# Altium schematic symbol library 场效应管.SchLib: 1062 symbols (part 3 of 4)
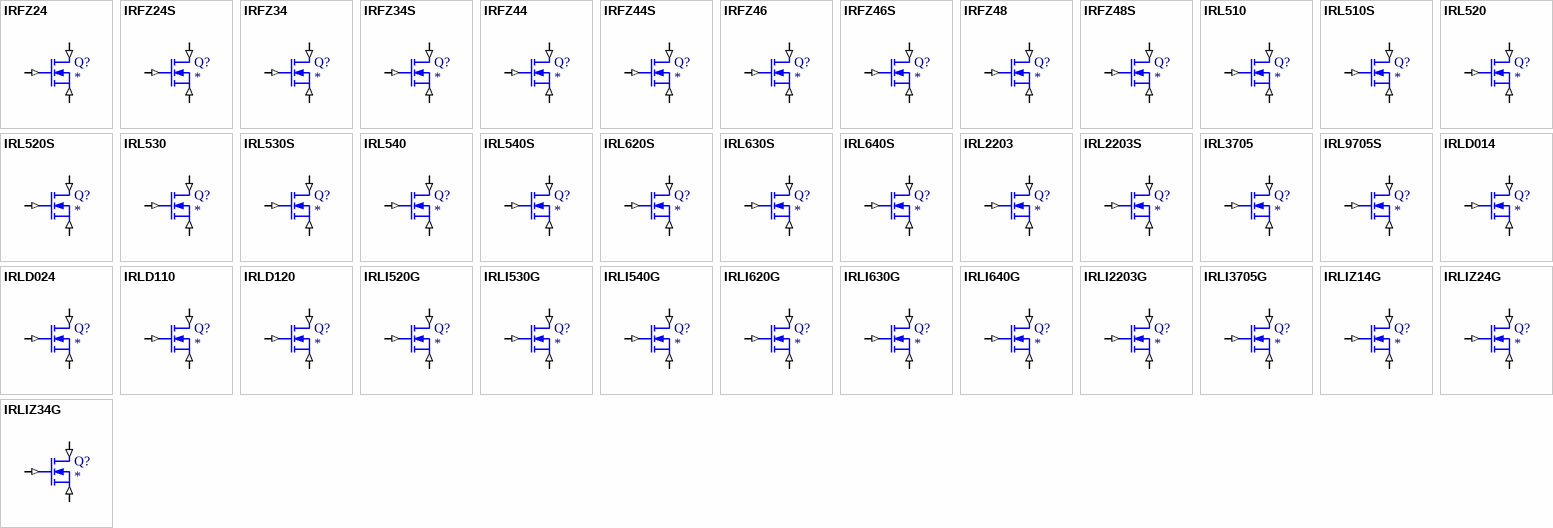
[diagram p28: symbols IRFZ24 to IRLIZ34G]

## IRL630S
designator Q?
N-Channel MOSFET
simulation model IRL630S (SUBCKT)
pins: 1 D (in), 2 G (in), 3 S (in)
1 alternate drawing of the same symbol

## IRL640S
designator Q?
N-Channel MOSFET
simulation model IRL640S (SUBCKT)
pins: 1 D (in), 2 G (in), 3 S (in)
1 alternate drawing of the same symbol

## IRL2203
designator Q?
N-Channel MOSFET
simulation model IRL2203 (SUBCKT)
pins: 1 D (in), 2 G (in), 3 S (in)
1 alternate drawing of the same symbol

## IRL2203S
designator Q?
N-Channel MOSFET
simulation model IRL2203S (SUBCKT)
pins: 1 D (in), 2 G (in), 3 S (in)
1 alternate drawing of the same symbol

## IRL3705
designator Q?
N-Channel MOSFET
simulation model IRL3705 (SUBCKT)
pins: 1 D (in), 2 G (in), 3 S (in)
1 alternate drawing of the same symbol

## IRL9705S
designator Q?
N-Channel MOSFET
simulation model IRL9705S (SUBCKT)
pins: 1 D (in), 2 G (in), 3 S (in)
1 alternate drawing of the same symbol

## IRLD014
designator Q?
N-Channel MOSFET
simulation model IRLD014 (SUBCKT)
pins: 1 D (in), 2 G (in), 3 S (in)
1 alternate drawing of the same symbol

## IRLD024
designator Q?
N-Channel MOSFET
simulation model IRLD024 (SUBCKT)
pins: 1 D (in), 2 G (in), 3 S (in)
1 alternate drawing of the same symbol

## IRLD110
designator Q?
N-Channel MOSFET
simulation model IRLD110 (SUBCKT)
pins: 1 D (in), 2 G (in), 3 S (in)
1 alternate drawing of the same symbol

## IRLD120
designator Q?
N-Channel MOSFET
simulation model IRLD120 (SUBCKT)
pins: 1 D (in), 2 G (in), 3 S (in)
1 alternate drawing of the same symbol

## IRLI520G
designator Q?
N-Channel MOSFET
simulation model IRLI520G (SUBCKT)
pins: 1 D (in), 2 G (in), 3 S (in)
1 alternate drawing of the same symbol

## IRLI530G
designator Q?
N-Channel MOSFET
simulation model IRLI530G (SUBCKT)
pins: 1 D (in), 2 G (in), 3 S (in)
1 alternate drawing of the same symbol

## IRLI540G
designator Q?
N-Channel MOSFET
simulation model IRLI540G (SUBCKT)
pins: 1 D (in), 2 G (in), 3 S (in)
1 alternate drawing of the same symbol

## IRLI620G
designator Q?
N-Channel MOSFET
simulation model IRLI620G (SUBCKT)
pins: 1 D (in), 2 G (in), 3 S (in)
1 alternate drawing of the same symbol

## IRLI630G
designator Q?
N-Channel MOSFET
simulation model IRLI630G (SUBCKT)
pins: 1 D (in), 2 G (in), 3 S (in)
1 alternate drawing of the same symbol

## IRLI640G
designator Q?
N-Channel MOSFET
simulation model IRLI640G (SUBCKT)
pins: 1 D (in), 2 G (in), 3 S (in)
1 alternate drawing of the same symbol

## IRLI2203G
designator Q?
N-Channel MOSFET
simulation model IRLI2203G (SUBCKT)
pins: 1 D (in), 2 G (in), 3 S (in)
1 alternate drawing of the same symbol

## IRLI3705G
designator Q?
N-Channel MOSFET
simulation model IRLI3705G (SUBCKT)
pins: 1 D (in), 2 G (in), 3 S (in)
1 alternate drawing of the same symbol

## IRLIZ14G
designator Q?
N-Channel MOSFET
simulation model IRLIZ14G (SUBCKT)
pins: 1 D (in), 2 G (in), 3 S (in)
1 alternate drawing of the same symbol

## IRLIZ24G
designator Q?
N-Channel MOSFET
simulation model IRLIZ24G (SUBCKT)
pins: 1 D (in), 2 G (in), 3 S (in)
1 alternate drawing of the same symbol

## IRLIZ34G
designator Q?
N-Channel MOSFET
simulation model IRLIZ34G (SUBCKT)
pins: 1 D (in), 2 G (in), 3 S (in)
1 alternate drawing of the same symbol

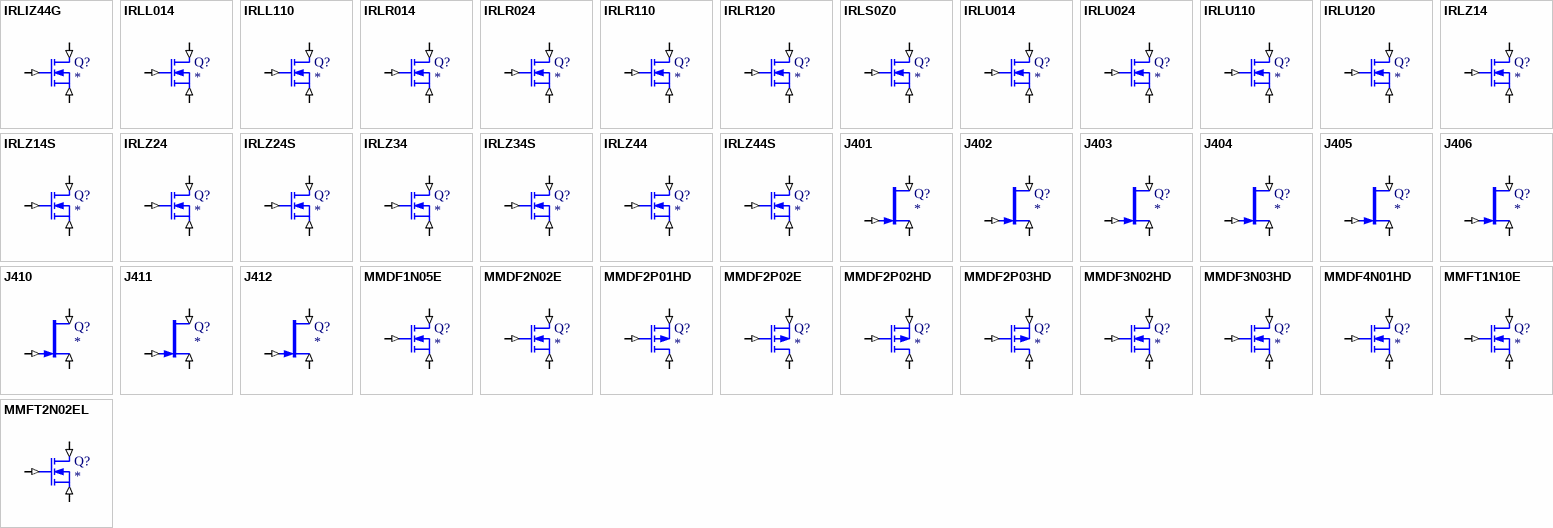
[diagram p17: symbols IRLIZ44G to MMFT2N02EL]

## IRLIZ44G
designator Q?
N-Channel MOSFET
simulation model IRLIZ44G (SUBCKT)
pins: 1 D (in), 2 G (in), 3 S (in)
1 alternate drawing of the same symbol

## IRLL014
designator Q?
N-Channel MOSFET
simulation model IRLL014 (SUBCKT)
pins: 1 D (in), 2 G (in), 3 S (in)
1 alternate drawing of the same symbol

## IRLL110
designator Q?
N-Channel MOSFET
simulation model IRLL110 (SUBCKT)
pins: 1 D (in), 2 G (in), 3 S (in)
1 alternate drawing of the same symbol

## IRLR014
designator Q?
N-Channel MOSFET
simulation model IRLR014 (SUBCKT)
pins: 1 D (in), 2 G (in), 3 S (in)
1 alternate drawing of the same symbol

## IRLR024
designator Q?
N-Channel MOSFET
simulation model IRLR024 (SUBCKT)
pins: 1 D (in), 2 G (in), 3 S (in)
1 alternate drawing of the same symbol

## IRLR110
designator Q?
N-Channel MOSFET
simulation model IRLR110 (SUBCKT)
pins: 1 D (in), 2 G (in), 3 S (in)
1 alternate drawing of the same symbol

## IRLR120
designator Q?
N-Channel MOSFET
simulation model IRLR120 (SUBCKT)
pins: 1 D (in), 2 G (in), 3 S (in)
1 alternate drawing of the same symbol

## IRLS0Z0
designator Q?
N-Channel MOSFET
simulation model IRLS0Z0 (SUBCKT)
pins: 1 D (in), 2 G (in), 3 S (in)
1 alternate drawing of the same symbol

## IRLU014
designator Q?
N-Channel MOSFET
simulation model IRLU014 (SUBCKT)
pins: 1 D (in), 2 G (in), 3 S (in)
1 alternate drawing of the same symbol

## IRLU024
designator Q?
N-Channel MOSFET
simulation model IRLU024 (SUBCKT)
pins: 1 D (in), 2 G (in), 3 S (in)
1 alternate drawing of the same symbol

## IRLU110
designator Q?
N-Channel MOSFET
simulation model IRLU110 (SUBCKT)
pins: 1 D (in), 2 G (in), 3 S (in)
1 alternate drawing of the same symbol

## IRLU120
designator Q?
N-Channel MOSFET
simulation model IRLU120 (SUBCKT)
pins: 1 D (in), 2 G (in), 3 S (in)
1 alternate drawing of the same symbol

## IRLZ14
designator Q?
N-Channel MOSFET
simulation model IRLZ14 (SUBCKT)
pins: 1 D (in), 2 G (in), 3 S (in)
1 alternate drawing of the same symbol

## IRLZ14S
designator Q?
N-Channel MOSFET
simulation model IRLZ14S (SUBCKT)
pins: 1 D (in), 2 G (in), 3 S (in)
1 alternate drawing of the same symbol

## IRLZ24
designator Q?
N-Channel MOSFET
simulation model IRLZ24 (SUBCKT)
pins: 1 D (in), 2 G (in), 3 S (in)
1 alternate drawing of the same symbol

## IRLZ24S
designator Q?
N-Channel MOSFET
simulation model IRLZ24S (SUBCKT)
pins: 1 D (in), 2 G (in), 3 S (in)
1 alternate drawing of the same symbol

## IRLZ34
designator Q?
N-Channel MOSFET
simulation model IRLZ34 (SUBCKT)
pins: 1 D (in), 2 G (in), 3 S (in)
1 alternate drawing of the same symbol

## IRLZ34S
designator Q?
N-Channel MOSFET
simulation model IRLZ34S (SUBCKT)
pins: 1 D (in), 2 G (in), 3 S (in)
1 alternate drawing of the same symbol

## IRLZ44
designator Q?
N-Channel MOSFET
simulation model IRLZ44 (SUBCKT)
pins: 1 D (in), 2 G (in), 3 S (in)
1 alternate drawing of the same symbol

## IRLZ44S
designator Q?
N-Channel MOSFET
simulation model IRLZ44S (SUBCKT)
pins: 1 D (in), 2 G (in), 3 S (in)
1 alternate drawing of the same symbol

## J401
designator Q?
N-Channel JFET
simulation model J401 (NJFET)
pins: 1 D (in), 2 G (in), 3 S (in)
1 alternate drawing of the same symbol

## J402
designator Q?
N-Channel JFET
simulation model J402 (NJFET)
pins: 1 D (in), 2 G (in), 3 S (in)
1 alternate drawing of the same symbol

## J403
designator Q?
N-Channel JFET
simulation model J403 (NJFET)
pins: 1 D (in), 2 G (in), 3 S (in)
1 alternate drawing of the same symbol

## J404
designator Q?
N-Channel JFET
simulation model J404 (NJFET)
pins: 1 D (in), 2 G (in), 3 S (in)
1 alternate drawing of the same symbol

## J405
designator Q?
N-Channel JFET
simulation model J405 (NJFET)
pins: 1 D (in), 2 G (in), 3 S (in)
1 alternate drawing of the same symbol

## J406
designator Q?
N-Channel JFET
simulation model J406 (NJFET)
pins: 1 D (in), 2 G (in), 3 S (in)
1 alternate drawing of the same symbol

## J410
designator Q?
N-Channel JFET
simulation model J410 (NJFET)
pins: 1 D (in), 2 G (in), 3 S (in)
1 alternate drawing of the same symbol

## J411
designator Q?
N-Channel JFET
simulation model J411 (NJFET)
pins: 1 D (in), 2 G (in), 3 S (in)
1 alternate drawing of the same symbol

## J412
designator Q?
N-Channel JFET
simulation model J412 (NJFET)
pins: 1 D (in), 2 G (in), 3 S (in)
1 alternate drawing of the same symbol

## MMDF1N05E
designator Q?
N-Channel MOSFET
simulation model MMDF1N05E (SUBCKT)
pins: 1 D (in), 2 G (in), 3 S (in)
1 alternate drawing of the same symbol

## MMDF2N02E
designator Q?
N-Channel MOSFET
simulation model MMDF2N02E (SUBCKT)
pins: 1 D (in), 2 G (in), 3 S (in)
1 alternate drawing of the same symbol

## MMDF2P01HD
designator Q?
P-Channel MOSFET
simulation model MMDF2P01HD (SUBCKT)
pins: 1 D (in), 2 G (in), 3 S (in)
1 alternate drawing of the same symbol

## MMDF2P02E
designator Q?
P-Channel MOSFET
simulation model MMDF2P02E (SUBCKT)
pins: 1 D (in), 2 G (in), 3 S (in)
1 alternate drawing of the same symbol

## MMDF2P02HD
designator Q?
P-Channel MOSFET
simulation model MMDF2P02HD (SUBCKT)
pins: 1 D (in), 2 G (in), 3 S (in)
1 alternate drawing of the same symbol

## MMDF2P03HD
designator Q?
P-Channel MOSFET
simulation model MMDF2P03HD (SUBCKT)
pins: 1 D (in), 2 G (in), 3 S (in)
1 alternate drawing of the same symbol

## MMDF3N02HD
designator Q?
N-Channel MOSFET
simulation model MMDF3N02HD (SUBCKT)
pins: 1 D (in), 2 G (in), 3 S (in)
1 alternate drawing of the same symbol

## MMDF3N03HD
designator Q?
N-Channel MOSFET
simulation model MMDF3N03HD (SUBCKT)
pins: 1 D (in), 2 G (in), 3 S (in)
1 alternate drawing of the same symbol

## MMDF4N01HD
designator Q?
N-Channel MOSFET
simulation model MMDF4N01HD (SUBCKT)
pins: 1 D (in), 2 G (in), 3 S (in)
1 alternate drawing of the same symbol

## MMFT1N10E
designator Q?
N-Channel MOSFET
simulation model MMFT1N10E (SUBCKT)
pins: 1 D (in), 2 G (in), 3 S (in)
1 alternate drawing of the same symbol

## MMFT2N02EL
designator Q?
N-Channel MOSFET
simulation model MMFT2N02EL (SUBCKT)
pins: 1 D (in), 2 G (in), 3 S (in)
1 alternate drawing of the same symbol

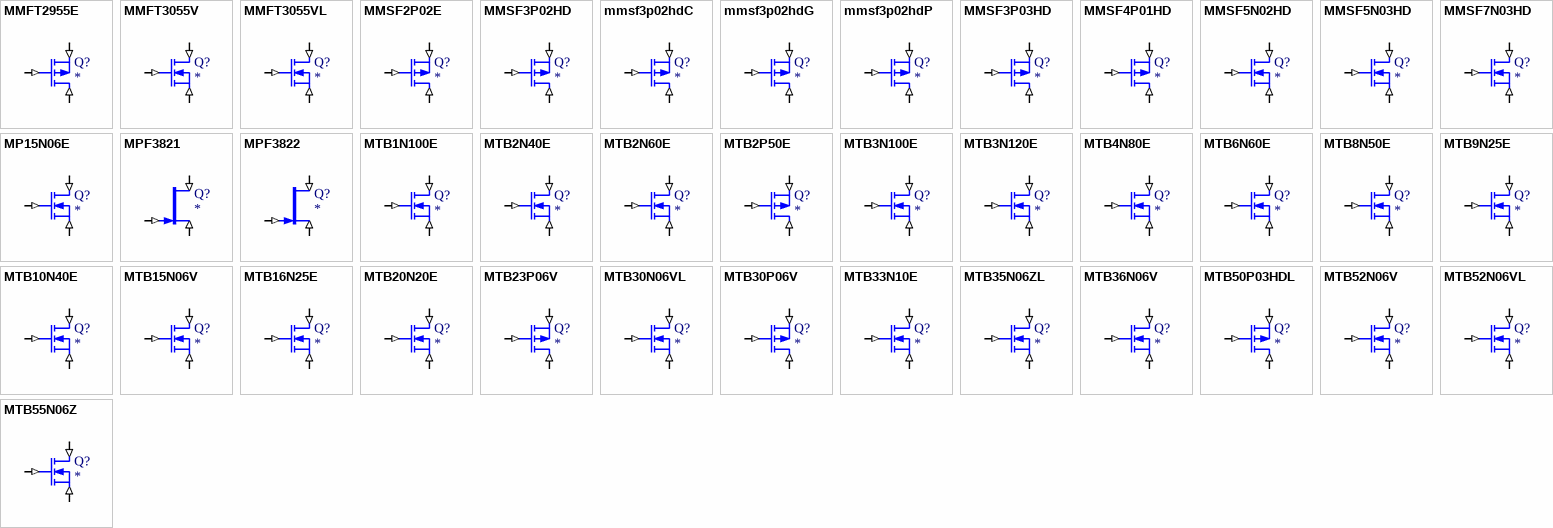
[diagram p18: symbols MMFT2955E to MTB55N06Z]

## MMFT2955E
designator Q?
P-Channel MOSFET
simulation model MMFT2955E (SUBCKT)
pins: 1 D (in), 2 G (in), 3 S (in)
1 alternate drawing of the same symbol

## MMFT3055V
designator Q?
N-Channel MOSFET
simulation model MMFT3055V (SUBCKT)
pins: 1 D (in), 2 G (in), 3 S (in)
1 alternate drawing of the same symbol

## MMFT3055VL
designator Q?
N-Channel MOSFET
simulation model MMFT3055VL (SUBCKT)
pins: 1 D (in), 2 G (in), 3 S (in)
1 alternate drawing of the same symbol

## MMSF2P02E
designator Q?
P-Channel MOSFET
simulation model MMSF2P02E (SUBCKT)
pins: 1 D (in), 2 G (in), 3 S (in)
1 alternate drawing of the same symbol

## MMSF3P02HD
designator Q?
P-Channel MOSFET
simulation model MMSF3P02HD (SUBCKT)
pins: 1 D (in), 2 G (in), 3 S (in)
1 alternate drawing of the same symbol

## mmsf3p02hdC
designator Q?
P-Channel MOSFET
simulation model mmsf3p02hdC (SUBCKT)
pins: 1 D (in), 2 G (in), 3 S (in)
1 alternate drawing of the same symbol

## mmsf3p02hdG
designator Q?
P-Channel MOSFET
simulation model mmsf3p02hdG (SUBCKT)
pins: 1 D (in), 2 G (in), 3 S (in)
1 alternate drawing of the same symbol

## mmsf3p02hdP
designator Q?
P-Channel MOSFET
simulation model mmsf3p02hdP (SUBCKT)
pins: 1 D (in), 2 G (in), 3 S (in)
1 alternate drawing of the same symbol

## MMSF3P03HD
designator Q?
P-Channel MOSFET
simulation model MMSF3P03HD (SUBCKT)
pins: 1 D (in), 2 G (in), 3 S (in)
1 alternate drawing of the same symbol

## MMSF4P01HD
designator Q?
P-Channel MOSFET
simulation model MMSF4P01HD (SUBCKT)
pins: 1 D (in), 2 G (in), 3 S (in)
1 alternate drawing of the same symbol

## MMSF5N02HD
designator Q?
N-Channel MOSFET
simulation model MMSF5N02HD (SUBCKT)
pins: 1 D (in), 2 G (in), 3 S (in)
1 alternate drawing of the same symbol

## MMSF5N03HD
designator Q?
N-Channel MOSFET
simulation model MMSF5N03HD (SUBCKT)
pins: 1 D (in), 2 G (in), 3 S (in)
1 alternate drawing of the same symbol

## MMSF7N03HD
designator Q?
N-Channel MOSFET
simulation model MMSF7N03HD (SUBCKT)
pins: 1 D (in), 2 G (in), 3 S (in)
1 alternate drawing of the same symbol

## MP15N06E
designator Q?
N-Channel MOSFET
simulation model MP15N06E (SUBCKT)
pins: 1 D (in), 2 G (in), 3 S (in)
1 alternate drawing of the same symbol

## MPF3821
designator Q?
N-Channel JFET
simulation model MPF3821 (NJFET)
pins: 1 D (in), 2 G (in), 3 S (in)
1 alternate drawing of the same symbol

## MPF3822
designator Q?
N-Channel JFET
simulation model MPF3822 (NJFET)
pins: 1 D (in), 2 G (in), 3 S (in)
1 alternate drawing of the same symbol

## MTB1N100E
designator Q?
N-Channel MOSFET
simulation model MTB1N100E (SUBCKT)
pins: 1 D (in), 2 G (in), 3 S (in)
1 alternate drawing of the same symbol

## MTB2N40E
designator Q?
N-Channel MOSFET
simulation model MTB2N40E (SUBCKT)
pins: 1 D (in), 2 G (in), 3 S (in)
1 alternate drawing of the same symbol

## MTB2N60E
designator Q?
N-Channel MOSFET
simulation model MTB2N60E (SUBCKT)
pins: 1 D (in), 2 G (in), 3 S (in)
1 alternate drawing of the same symbol

## MTB2P50E
designator Q?
P-Channel MOSFET
simulation model MTB2P50E (SUBCKT)
pins: 1 D (in), 2 G (in), 3 S (in)
1 alternate drawing of the same symbol

## MTB3N100E
designator Q?
N-Channel MOSFET
simulation model MTB3N100E (SUBCKT)
pins: 1 D (in), 2 G (in), 3 S (in)
1 alternate drawing of the same symbol

## MTB3N120E
designator Q?
N-Channel MOSFET
simulation model MTB3N120E (SUBCKT)
pins: 1 D (in), 2 G (in), 3 S (in)
1 alternate drawing of the same symbol

## MTB4N80E
designator Q?
N-Channel MOSFET
simulation model MTB4N80E (SUBCKT)
pins: 1 D (in), 2 G (in), 3 S (in)
1 alternate drawing of the same symbol

## MTB6N60E
designator Q?
N-Channel MOSFET
simulation model MTB6N60E (SUBCKT)
pins: 1 D (in), 2 G (in), 3 S (in)
1 alternate drawing of the same symbol

## MTB8N50E
designator Q?
N-Channel MOSFET
simulation model MTB8N50E (SUBCKT)
pins: 1 D (in), 2 G (in), 3 S (in)
1 alternate drawing of the same symbol

## MTB9N25E
designator Q?
N-Channel MOSFET
simulation model MTB9N25E (SUBCKT)
pins: 1 D (in), 2 G (in), 3 S (in)
1 alternate drawing of the same symbol

## MTB10N40E
designator Q?
N-Channel MOSFET
simulation model MTB10N40E (SUBCKT)
pins: 1 D (in), 2 G (in), 3 S (in)
1 alternate drawing of the same symbol

## MTB15N06V
designator Q?
N-Channel MOSFET
simulation model MTB15N06V (SUBCKT)
pins: 1 D (in), 2 G (in), 3 S (in)
1 alternate drawing of the same symbol

## MTB16N25E
designator Q?
N-Channel MOSFET
simulation model MTB16N25E (SUBCKT)
pins: 1 D (in), 2 G (in), 3 S (in)
1 alternate drawing of the same symbol

## MTB20N20E
designator Q?
N-Channel MOSFET
simulation model MTB20N20E (SUBCKT)
pins: 1 D (in), 2 G (in), 3 S (in)
1 alternate drawing of the same symbol

## MTB23P06V
designator Q?
P-Channel MOSFET
simulation model MTB23P06V (SUBCKT)
pins: 1 D (in), 2 G (in), 3 S (in)
1 alternate drawing of the same symbol

## MTB30N06VL
designator Q?
N-Channel MOSFET
simulation model MTB30N06VL (SUBCKT)
pins: 1 D (in), 2 G (in), 3 S (in)
1 alternate drawing of the same symbol

## MTB30P06V
designator Q?
P-Channel MOSFET
simulation model MTB30P06V (SUBCKT)
pins: 1 D (in), 2 G (in), 3 S (in)
1 alternate drawing of the same symbol

## MTB33N10E
designator Q?
N-Channel MOSFET
simulation model MTB33N10E (SUBCKT)
pins: 1 D (in), 2 G (in), 3 S (in)
1 alternate drawing of the same symbol

## MTB35N06ZL
designator Q?
N-Channel MOSFET
simulation model MTB35N06ZL (SUBCKT)
pins: 1 D (in), 2 G (in), 3 S (in)
1 alternate drawing of the same symbol

## MTB36N06V
designator Q?
N-Channel MOSFET
simulation model MTB36N06V (SUBCKT)
pins: 1 D (in), 2 G (in), 3 S (in)
1 alternate drawing of the same symbol

## MTB50P03HDL
designator Q?
P-Channel MOSFET
simulation model MTB50P03HDL (SUBCKT)
pins: 1 D (in), 2 G (in), 3 S (in)
1 alternate drawing of the same symbol

## MTB52N06V
designator Q?
N-Channel MOSFET
simulation model MTB52N06V (SUBCKT)
pins: 1 D (in), 2 G (in), 3 S (in)
1 alternate drawing of the same symbol

## MTB52N06VL
designator Q?
N-Channel MOSFET
simulation model MTB52N06VL (SUBCKT)
pins: 1 D (in), 2 G (in), 3 S (in)
1 alternate drawing of the same symbol

## MTB55N06Z
designator Q?
N-Channel MOSFET
simulation model MTB55N06Z (SUBCKT)
pins: 1 D (in), 2 G (in), 3 S (in)
1 alternate drawing of the same symbol

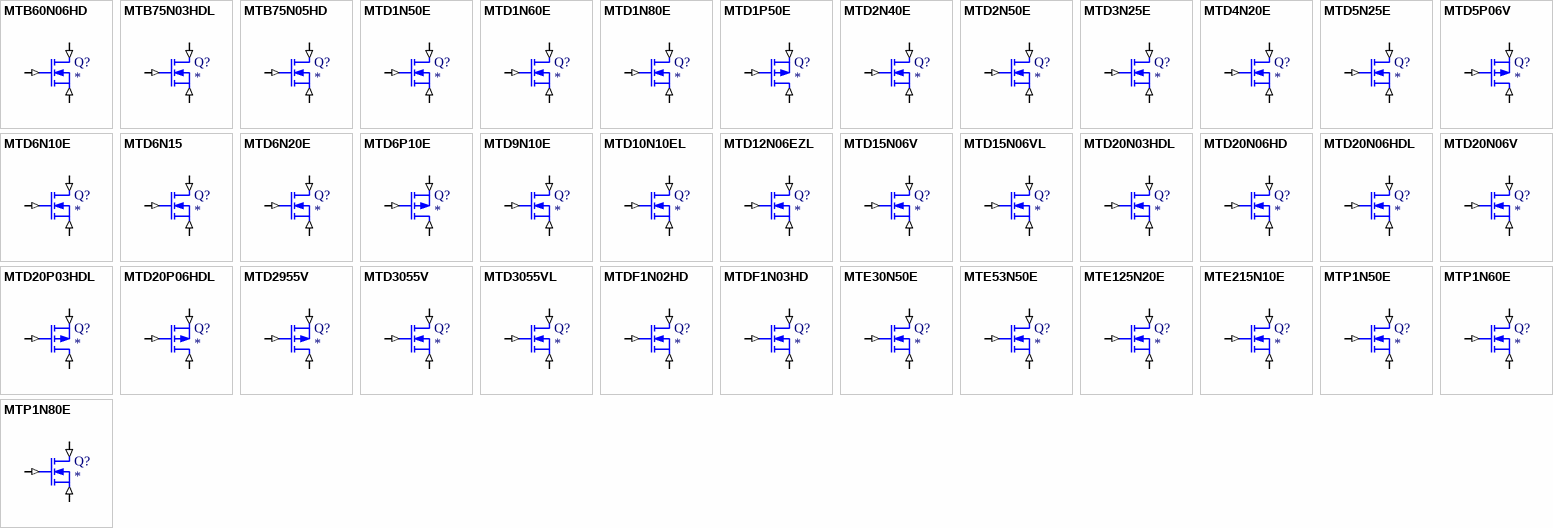
[diagram p19: symbols MTB60N06HD to MTP1N80E]

## MTB60N06HD
designator Q?
N-Channel MOSFET
simulation model MTB60N06HD (SUBCKT)
pins: 1 D (in), 2 G (in), 3 S (in)
1 alternate drawing of the same symbol

## MTB75N03HDL
designator Q?
N-Channel MOSFET
simulation model MTB75N03HDL (SUBCKT)
pins: 1 D (in), 2 G (in), 3 S (in)
1 alternate drawing of the same symbol

## MTB75N05HD
designator Q?
N-Channel MOSFET
simulation model MTB75N05HD (SUBCKT)
pins: 1 D (in), 2 G (in), 3 S (in)
1 alternate drawing of the same symbol

## MTD1N50E
designator Q?
N-Channel MOSFET
simulation model MTD1N50E (SUBCKT)
pins: 1 D (in), 2 G (in), 3 S (in)
1 alternate drawing of the same symbol

## MTD1N60E
designator Q?
N-Channel MOSFET
simulation model MTD1N60E (SUBCKT)
pins: 1 D (in), 2 G (in), 3 S (in)
1 alternate drawing of the same symbol

## MTD1N80E
designator Q?
N-Channel MOSFET
simulation model MTD1N80E (SUBCKT)
pins: 1 D (in), 2 G (in), 3 S (in)
1 alternate drawing of the same symbol

## MTD1P50E
designator Q?
P-Channel MOSFET
simulation model MTD1P50E (SUBCKT)
pins: 1 D (in), 2 G (in), 3 S (in)
1 alternate drawing of the same symbol

## MTD2N40E
designator Q?
N-Channel MOSFET
simulation model MTD2N40E (SUBCKT)
pins: 1 D (in), 2 G (in), 3 S (in)
1 alternate drawing of the same symbol

## MTD2N50E
designator Q?
N-Channel MOSFET
simulation model MTD2N50E (SUBCKT)
pins: 1 D (in), 2 G (in), 3 S (in)
1 alternate drawing of the same symbol

## MTD3N25E
designator Q?
N-Channel MOSFET
simulation model MTD3N25E (SUBCKT)
pins: 1 D (in), 2 G (in), 3 S (in)
1 alternate drawing of the same symbol

## MTD4N20E
designator Q?
N-Channel MOSFET
simulation model MTD4N20E (SUBCKT)
pins: 1 D (in), 2 G (in), 3 S (in)
1 alternate drawing of the same symbol

## MTD5N25E
designator Q?
N-Channel MOSFET
simulation model MTD5N25E (SUBCKT)
pins: 1 D (in), 2 G (in), 3 S (in)
1 alternate drawing of the same symbol

## MTD5P06V
designator Q?
P-Channel MOSFET
simulation model MTD5P06V (SUBCKT)
pins: 1 D (in), 2 G (in), 3 S (in)
1 alternate drawing of the same symbol

## MTD6N10E
designator Q?
N-Channel MOSFET
simulation model MTD6N10E (SUBCKT)
pins: 1 D (in), 2 G (in), 3 S (in)
1 alternate drawing of the same symbol

## MTD6N15
designator Q?
N-Channel MOSFET
simulation model MTD6N15 (SUBCKT)
pins: 1 D (in), 2 G (in), 3 S (in)
1 alternate drawing of the same symbol

## MTD6N20E
designator Q?
N-Channel MOSFET
simulation model MTD6N20E (SUBCKT)
pins: 1 D (in), 2 G (in), 3 S (in)
1 alternate drawing of the same symbol

## MTD6P10E
designator Q?
P-Channel MOSFET
simulation model MTD6P10E (SUBCKT)
pins: 1 D (in), 2 G (in), 3 S (in)
1 alternate drawing of the same symbol

## MTD9N10E
designator Q?
N-Channel MOSFET
simulation model MTD9N10E (SUBCKT)
pins: 1 D (in), 2 G (in), 3 S (in)
1 alternate drawing of the same symbol

## MTD10N10EL
designator Q?
N-Channel MOSFET
simulation model MTD10N10EL (SUBCKT)
pins: 1 D (in), 2 G (in), 3 S (in)
1 alternate drawing of the same symbol

## MTD12N06EZL
designator Q?
N-Channel MOSFET
simulation model MTD12N06EZL (SUBCKT)
pins: 1 D (in), 2 G (in), 3 S (in)
1 alternate drawing of the same symbol

## MTD15N06V
designator Q?
N-Channel MOSFET
simulation model MTD15N06V (SUBCKT)
pins: 1 D (in), 2 G (in), 3 S (in)
1 alternate drawing of the same symbol

## MTD15N06VL
designator Q?
N-Channel MOSFET
simulation model MTD15N06VL (SUBCKT)
pins: 1 D (in), 2 G (in), 3 S (in)
1 alternate drawing of the same symbol

## MTD20N03HDL
designator Q?
N-Channel MOSFET
simulation model MTD20N03HDL (SUBCKT)
pins: 1 D (in), 2 G (in), 3 S (in)
1 alternate drawing of the same symbol

## MTD20N06HD
designator Q?
N-Channel MOSFET
simulation model MTD20N06HD (SUBCKT)
pins: 1 D (in), 2 G (in), 3 S (in)
1 alternate drawing of the same symbol

## MTD20N06HDL
designator Q?
N-Channel MOSFET
simulation model MTD20N06HDL (SUBCKT)
pins: 1 D (in), 2 G (in), 3 S (in)
1 alternate drawing of the same symbol

## MTD20N06V
designator Q?
N-Channel MOSFET
simulation model MTD20N06V (SUBCKT)
pins: 1 D (in), 2 G (in), 3 S (in)
1 alternate drawing of the same symbol

## MTD20P03HDL
designator Q?
P-Channel MOSFET
simulation model MTD20P03HDL (SUBCKT)
pins: 1 D (in), 2 G (in), 3 S (in)
1 alternate drawing of the same symbol

## MTD20P06HDL
designator Q?
P-Channel MOSFET
simulation model MTD20P06HDL (SUBCKT)
pins: 1 D (in), 2 G (in), 3 S (in)
1 alternate drawing of the same symbol

## MTD2955V
designator Q?
P-Channel MOSFET
simulation model MTD2955V (SUBCKT)
pins: 1 D (in), 2 G (in), 3 S (in)
1 alternate drawing of the same symbol

## MTD3055V
designator Q?
N-Channel MOSFET
simulation model MTD3055V (SUBCKT)
pins: 1 D (in), 2 G (in), 3 S (in)
1 alternate drawing of the same symbol

## MTD3055VL
designator Q?
N-Channel MOSFET
simulation model MTD3055VL (SUBCKT)
pins: 1 D (in), 2 G (in), 3 S (in)
1 alternate drawing of the same symbol

## MTDF1N02HD
designator Q?
N-Channel MOSFET
simulation model MTDF1N02HD (SUBCKT)
pins: 1 D (in), 2 G (in), 3 S (in)
1 alternate drawing of the same symbol

## MTDF1N03HD
designator Q?
N-Channel MOSFET
simulation model MTDF1N03HD (SUBCKT)
pins: 1 D (in), 2 G (in), 3 S (in)
1 alternate drawing of the same symbol

## MTE30N50E
designator Q?
N-Channel MOSFET
simulation model MTE30N50E (SUBCKT)
pins: 1 D (in), 2 G (in), 3 S (in)
1 alternate drawing of the same symbol

## MTE53N50E
designator Q?
N-Channel MOSFET
simulation model MTE53N50E (SUBCKT)
pins: 1 D (in), 2 G (in), 3 S (in)
1 alternate drawing of the same symbol

## MTE125N20E
designator Q?
N-Channel MOSFET
simulation model MTE125N20E (SUBCKT)
pins: 1 D (in), 2 G (in), 3 S (in)
1 alternate drawing of the same symbol

## MTE215N10E
designator Q?
N-Channel MOSFET
simulation model MTE215N10E (SUBCKT)
pins: 1 D (in), 2 G (in), 3 S (in)
1 alternate drawing of the same symbol

## MTP1N50E
designator Q?
N-Channel MOSFET
simulation model MTP1N50E (SUBCKT)
pins: 1 D (in), 2 G (in), 3 S (in)
1 alternate drawing of the same symbol

## MTP1N60E
designator Q?
N-Channel MOSFET
simulation model MTP1N60E (SUBCKT)
pins: 1 D (in), 2 G (in), 3 S (in)
1 alternate drawing of the same symbol

## MTP1N80E
designator Q?
N-Channel MOSFET
simulation model MTP1N80E (SUBCKT)
pins: 1 D (in), 2 G (in), 3 S (in)
1 alternate drawing of the same symbol

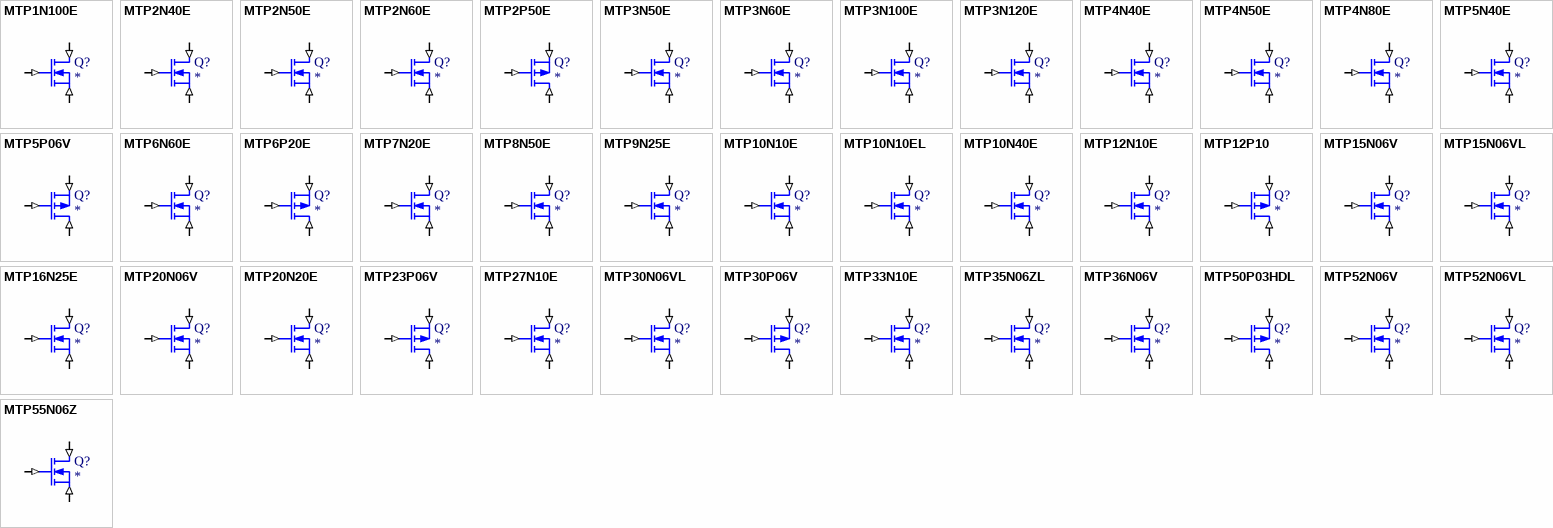
[diagram p20: symbols MTP1N100E to MTP55N06Z]

## MTP1N100E
designator Q?
N-Channel MOSFET
simulation model MTP1N100E (SUBCKT)
pins: 1 D (in), 2 G (in), 3 S (in)
1 alternate drawing of the same symbol

## MTP2N40E
designator Q?
N-Channel MOSFET
simulation model MTP2N40E (SUBCKT)
pins: 1 D (in), 2 G (in), 3 S (in)
1 alternate drawing of the same symbol

## MTP2N50E
designator Q?
N-Channel MOSFET
simulation model MTP2N50E (SUBCKT)
pins: 1 D (in), 2 G (in), 3 S (in)
1 alternate drawing of the same symbol

## MTP2N60E
designator Q?
N-Channel MOSFET
simulation model MTP2N60E (SUBCKT)
pins: 1 D (in), 2 G (in), 3 S (in)
1 alternate drawing of the same symbol

## MTP2P50E
designator Q?
P-Channel MOSFET
simulation model MTP2P50E (SUBCKT)
pins: 1 D (in), 2 G (in), 3 S (in)
1 alternate drawing of the same symbol

## MTP3N50E
designator Q?
N-Channel MOSFET
simulation model MTP3N50E (SUBCKT)
pins: 1 D (in), 2 G (in), 3 S (in)
1 alternate drawing of the same symbol

## MTP3N60E
designator Q?
N-Channel MOSFET
simulation model MTP3N60E (SUBCKT)
pins: 1 D (in), 2 G (in), 3 S (in)
1 alternate drawing of the same symbol

## MTP3N100E
designator Q?
N-Channel MOSFET
simulation model MTP3N100E (SUBCKT)
pins: 1 D (in), 2 G (in), 3 S (in)
1 alternate drawing of the same symbol

## MTP3N120E
designator Q?
N-Channel MOSFET
simulation model MTP3N120E (SUBCKT)
pins: 1 D (in), 2 G (in), 3 S (in)
1 alternate drawing of the same symbol

## MTP4N40E
designator Q?
N-Channel MOSFET
simulation model MTP4N40E (SUBCKT)
pins: 1 D (in), 2 G (in), 3 S (in)
1 alternate drawing of the same symbol

## MTP4N50E
designator Q?
N-Channel MOSFET
simulation model MTP4N50E (SUBCKT)
pins: 1 D (in), 2 G (in), 3 S (in)
1 alternate drawing of the same symbol

## MTP4N80E
designator Q?
N-Channel MOSFET
simulation model MTP4N80E (SUBCKT)
pins: 1 D (in), 2 G (in), 3 S (in)
1 alternate drawing of the same symbol

## MTP5N40E
designator Q?
N-Channel MOSFET
simulation model MTP5N40E (SUBCKT)
pins: 1 D (in), 2 G (in), 3 S (in)
1 alternate drawing of the same symbol

## MTP5P06V
designator Q?
P-Channel MOSFET
simulation model MTP5P06V (SUBCKT)
pins: 1 D (in), 2 G (in), 3 S (in)
1 alternate drawing of the same symbol